# Altium footprint library X98_CARRIER_V1R2_12082022.PcbLib: 104 footprints (part 5 of 7)
Each footprint in its own frame and in the unit in brackets; x right, y up, seen from the top. Pads: shape width x height; smd on the part's side, far side on the other; paste and mask are expansions set on the pad; w line width, h text height; cw(c..) or ccw(c..) is an arc to the next point about the centre after c.
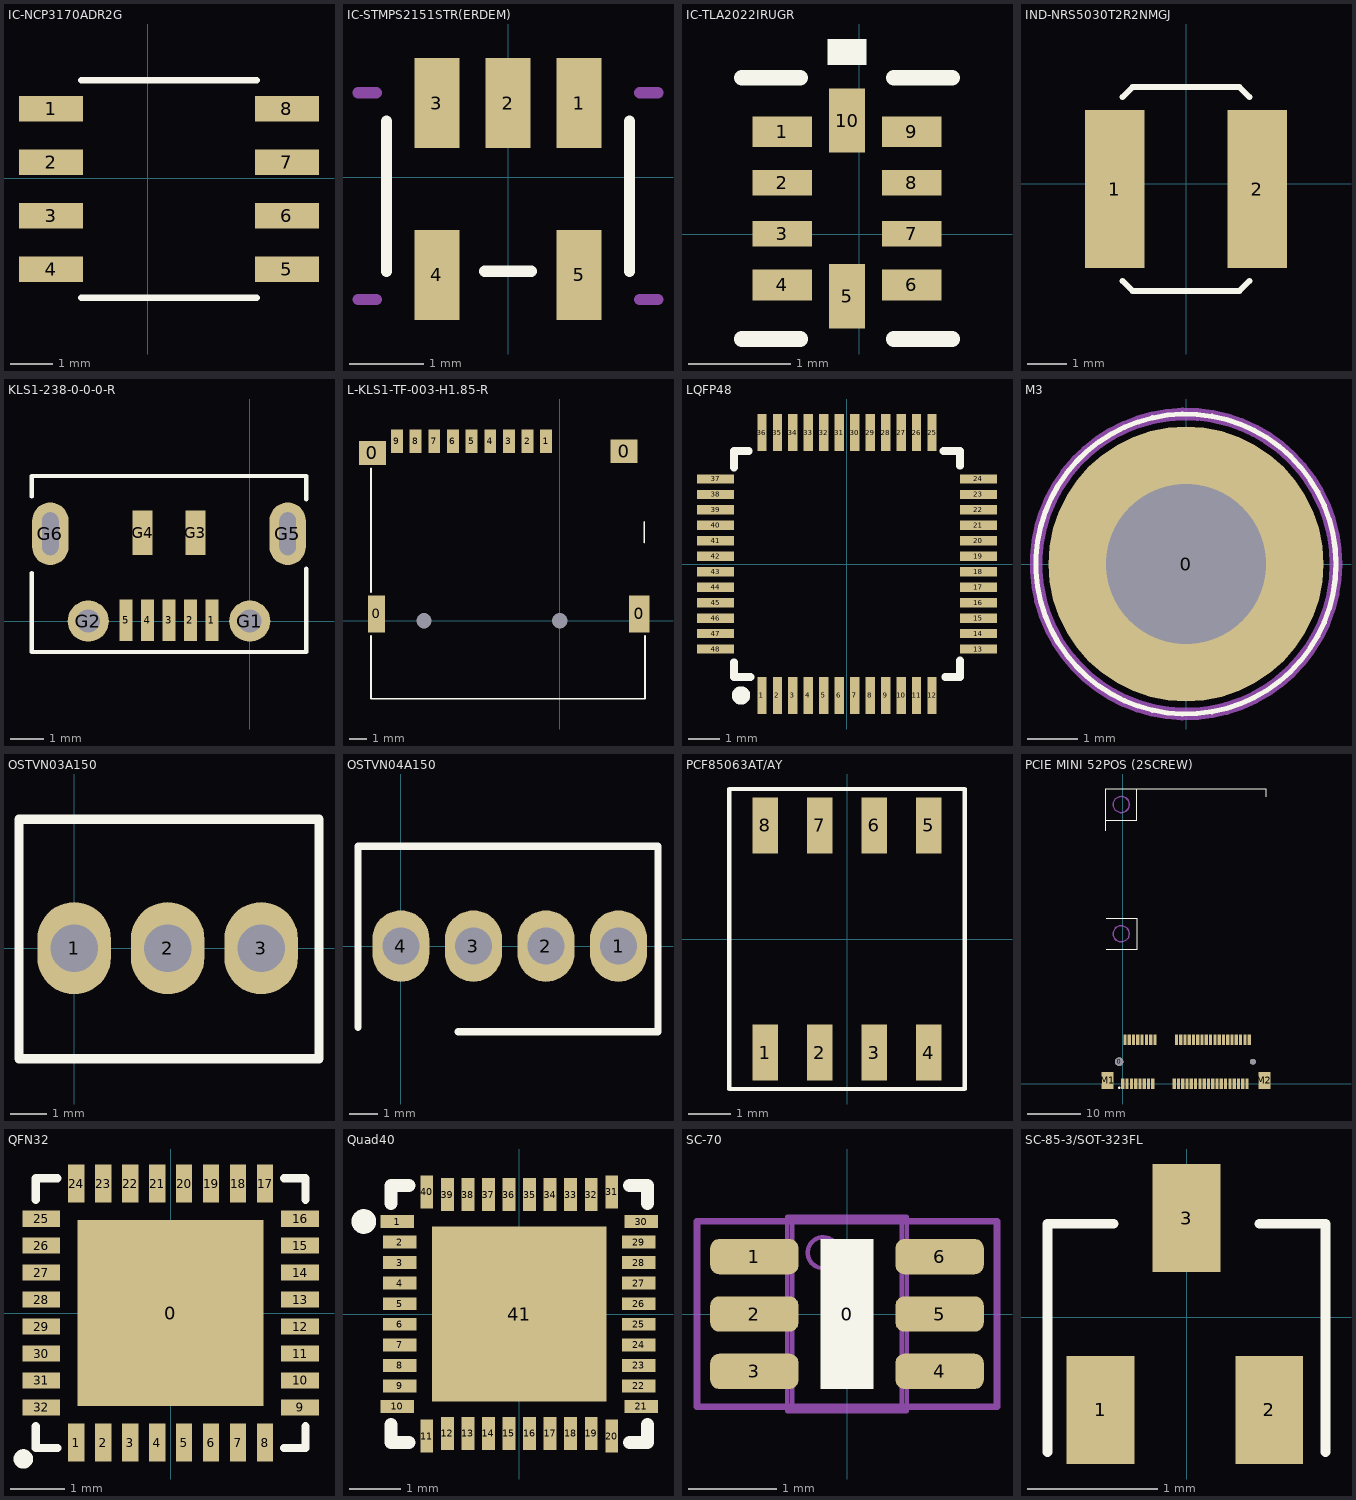
[diagram p4: the footprints below, top view; thin cyan lines are the x and y axes]

## IC-NCP3170ADR2G [mm]
pads (8):
  rect 1.52x0.6 smd paste+0 mask+0.05: 1(-2.294,1.651) 2(-2.294,0.381) 3(-2.294,-0.889) 4(-2.294,-2.159) 5(3.31,-2.159) 6(3.31,-0.889) 7(3.31,0.381) 8(3.31,1.651)
Top Overlay:
  lines w0.152: -1.575,-2.832 2.591,-2.832 ; -1.575,2.324 2.591,2.324
  text "." at -2.531,2.196 h0.76
3D body: height 0.25, standoff 0, extent 0.508,-0.254 0.762,0
3D body "SOIC8_ONS.step": height 1.76, standoff 0, extent -2.464,-2.705 3.734,2.197

## IC-STMPS2151STR(ERDEM) [mm]
pads (5):
  rect 0.6x1.2 smd paste+0 mask+0.05: 1(0.95,0.991) 2(0,0.991) 3(-0.95,0.991) 4(-0.95,-1.309) 5(0.95,-1.309)
Top Overlay:
  lines w0.152: -1.626,-1.257 -1.626,0.749 ; -0.312,-1.257 0.312,-1.257 ; 1.626,-1.257 1.626,0.749
  text "." at 0.816,2.058 h0.76
Mechanical 15:
  lines w0.152: -2.007,-1.638 -1.763,-1.638 ; -2.007,1.13 -1.763,1.13 ; 1.763,-1.638 2.007,-1.638 ; 1.763,1.13 2.007,1.13
3D body "SOT23-5L_STM-M.step": height 1.45, standoff 0, extent -1.499,-1.753 1.499,1.245

## IC-TLA2022IRUGR [mm]
pads (10):
  rect 0.58x0.3 smd paste-0.15 mask+0: 1(-0.754,1.004) 4(-0.754,-0.496) 6(0.516,-0.496) 9(0.516,1.004)
  rect 0.58x0.25 smd mask+0: 2(-0.754,0.504) 3(-0.754,0.004) 7(0.516,0.004) 8(0.516,0.504)
  rect 0.35x0.63 smd mask+0: 5(-0.119,-0.606) 10(-0.119,1.114)
Top Overlay:
  region: 0.072,1.658 -0.309,1.658 -0.309,1.912 0.072,1.912
  lines w0.152: -1.148,-1.025 -0.578,-1.025 ; -1.148,1.533 -0.578,1.533 ; 0.34,-1.025 0.91,-1.025 ; 0.34,1.533 0.91,1.533
  text "." at -1.276,0.917 h0.76
Top Paste:
  region: 0.006,1.379 -0.244,1.379 -0.244,0.849 0.006,0.849
  region: 0.781,1.129 0.251,1.129 0.251,0.879 0.781,0.879
  region: 0.781,0.629 0.251,0.629 0.251,0.379 0.781,0.379
  region: 0.781,0.129 0.251,0.129 0.251,-0.121 0.781,-0.121
  region: 0.781,-0.371 0.251,-0.371 0.251,-0.621 0.781,-0.621
  region: 0.006,-0.341 -0.244,-0.341 -0.244,-0.871 0.006,-0.871
  region: -0.489,-0.371 -1.019,-0.371 -1.019,-0.621 -0.489,-0.621
  region: -0.489,0.129 -1.019,0.129 -1.019,-0.121 -0.489,-0.121
  region: -0.489,0.629 -1.019,0.629 -1.019,0.379 -0.489,0.379
  region: -0.489,1.129 -1.019,1.129 -1.019,0.879 -0.489,0.879
Top Solder:
  region: 0.081,1.454 -0.319,1.454 -0.319,0.774 0.081,0.774
  region: 0.856,1.204 0.176,1.204 0.176,0.804 0.856,0.804
  region: 0.856,0.704 0.176,0.704 0.176,0.304 0.856,0.304
  region: 0.856,0.204 0.176,0.204 0.176,-0.196 0.856,-0.196
  region: 0.856,-0.296 0.176,-0.296 0.176,-0.696 0.856,-0.696
  region: 0.081,-0.266 -0.319,-0.266 -0.319,-0.946 0.081,-0.946
  region: -0.414,-0.296 -1.094,-0.296 -1.094,-0.696 -0.414,-0.696
  region: -0.414,0.204 -1.094,0.204 -1.094,-0.196 -0.414,-0.196
  region: -0.414,0.704 -1.094,0.704 -1.094,0.304 -0.414,0.304
  region: -0.414,1.204 -1.094,1.204 -1.094,0.804 -0.414,0.804
3D body: height 0.25, standoff 0, extent -0.119,0.254 0.135,0.508
3D body "RUG0010A.stp": height 0.4, standoff 0, extent -0.869,-0.746 0.631,1.254

## IND-NRS5030T2R2NMGJ [mil]
pads (2):
  rect 59x157 smd paste+0 mask+1.97: 1(-70.87,-5) 2(70.87,-5)
Top Overlay:
  lines w6: -63.15,-96.6 -53.25,-106.5 53.25,-106.5 63.15,-96.6 ; -63.15,86.6 -53.25,96.5 53.25,96.5 63.15,86.6
3D body "LQH5BPN3R3N38L.STEP": height 157.48, standoff 0, extent -96.46,-101.46 96.46,91.46

## KLS1-238-0-0-0-R [mm] "MICRO USB TYPE B"
height 3
pads (11):
  rect 0.4x1.25 smd: 1(-1.15,0.025) 2(-1.8,0.025) 3(-2.45,0.025) 4(-3.1,0.025) 5(-3.75,0.025)
  round 1.25 hole 0.7: G1(0,0) G2(-4.9,0)
  rect 0.6x1.35 smd: G3(-1.65,2.675) G4(-3.25,2.675)
  oval 1.1x1.9 hole 0.5 slot 1.3 at 90 deg: G5(1.15,2.65) G6(-6.05,2.65)
Top Overlay:
  lines w0.127: -6.616,1.464 -6.616,-0.782 -6.616,-0.934 1.716,-0.934 1.716,1.591 ; -6.616,3.776 -6.616,4.4 1.716,4.4 1.716,3.7
Top Paste:
  circle w0.94: c-4.9,0 r0.127
  circle w0.94: c0,0 r0.127
  region: -6.583,2.244 -6.583,2.137 -6.502,1.941 -6.352,1.791 -6.156,1.71 -6.05,1.71 -5.944,1.71 -5.748,1.791 -5.598,1.941 -5.517,2.137 -5.517,2.244 -5.517,3.031 -5.517,3.137 -5.598,3.333 -5.748,3.483 -5.944,3.564 -6.05,3.564 -6.156,3.564 -6.352,3.483 -6.502,3.333 -6.583,3.137 -6.583,3.031
  region: 0.617,2.244 0.617,2.137 0.698,1.941 0.848,1.791 1.044,1.71 1.15,1.71 1.256,1.71 1.452,1.791 1.602,1.941 1.683,2.137 1.683,2.244 1.683,3.031 1.683,3.137 1.602,3.333 1.452,3.483 1.256,3.564 1.15,3.564 1.044,3.564 0.848,3.483 0.698,3.333 0.617,3.137 0.617,3.031
Bottom Paste:
  circle w0.94: c-4.9,0 r0.127
  circle w0.94: c0,0 r0.127
  region: 1.683,2.244 1.683,2.137 1.602,1.941 1.452,1.791 1.256,1.71 1.15,1.71 1.044,1.71 0.848,1.791 0.698,1.941 0.617,2.137 0.617,2.244 0.617,3.031 0.617,3.137 0.698,3.333 0.848,3.483 1.044,3.564 1.15,3.564 1.256,3.564 1.452,3.483 1.602,3.333 1.683,3.137 1.683,3.031
  region: -5.517,2.244 -5.517,2.137 -5.598,1.941 -5.748,1.791 -5.944,1.71 -6.05,1.71 -6.156,1.71 -6.352,1.791 -6.502,1.941 -6.583,2.137 -6.583,2.244 -6.583,3.031 -6.583,3.137 -6.502,3.333 -6.352,3.483 -6.156,3.564 -6.05,3.564 -5.944,3.564 -5.748,3.483 -5.598,3.333 -5.517,3.137 -5.517,3.031
3D body "micro usb.stp": height 2.84, standoff -0.54, extent -6.8,-0.294 1.85,5.605

## L-KLS1-TF-003-H1.85-R [mm]
pads (15):
  rect 1.6x1.4 smd mask+0.051: 0(-11.05,9.9) 0(3.8,10)
  rect 1x2.2 smd mask+0.051: 0(-10.8,0.4)
  round 0 hole 0.9: 0(-8,0) 0(0,0)
  rect 1.2x2.2 smd mask+0.051: 0(4.7,0.4)
  rect 0.7x1.4 smd mask+0.051: 1(-0.799,10.6) 2(-1.899,10.6) 3(-2.999,10.6) 4(-4.099,10.6) 5(-5.199,10.6) 6(-6.299,10.6) 7(-7.399,10.6) 8(-8.499,10.6) 9(-9.599,10.6)
Top Overlay:
  lines w0.102: -11.127,-0.881 -11.127,-4.6 5.027,-4.6 5.027,-0.881 ; -11.127,1.681 -11.127,9 ; 4.989,5.834 4.992,4.62
3D body "micro sd.STEP": height 1.95, standoff -0.5, extent -11.05,-4.015 4.95,11.235

## LQFP48 [mm]
pads (48):
  rect 0.3x1.2 smd mask+0.051: 1(-2.75,-4.25) 2(-2.25,-4.25) 3(-1.75,-4.25) 4(-1.25,-4.25) 5(-0.75,-4.25) 6(-0.25,-4.25) 7(0.25,-4.25) 8(0.75,-4.25) 9(1.25,-4.25) 10(1.75,-4.25) 11(2.25,-4.25) 12(2.75,-4.25) 25(2.75,4.25) 26(2.25,4.25) 27(1.75,4.25) 28(1.25,4.25) 29(0.75,4.25) 30(0.25,4.25) 31(-0.25,4.25) 32(-0.75,4.25) 33(-1.25,4.25) 34(-1.75,4.25) 35(-2.25,4.25) 36(-2.75,4.25)
  rect 1.2x0.3 smd mask+0.051: 13(4.25,-2.75) 14(4.25,-2.25) 15(4.25,-1.75) 16(4.25,-1.25) 17(4.25,-0.75) 18(4.25,-0.25) 19(4.25,0.25) 20(4.25,0.75) 21(4.25,1.25) 22(4.25,1.75) 23(4.25,2.25) 24(4.25,2.75) 37(-4.25,2.75) 38(-4.25,2.25) 39(-4.25,1.75) 40(-4.25,1.25) 41(-4.25,0.75) 42(-4.25,0.25) 43(-4.25,-0.25) 44(-4.25,-0.75) 45(-4.25,-1.25) 46(-4.25,-1.75) 47(-4.25,-2.25) 48(-4.25,-2.75)
Top Overlay:
  circle w0.381: c-3.425,-4.25 r0.106
  lines w0.254: -3.65,-3.175 -3.65,-3.65 -3.125,-3.65 ; -3.65,3.125 -3.65,3.65 -3.175,3.65 ; 3.125,3.65 3.65,3.65 3.65,3.175 ; 3.175,-3.65 3.65,-3.65 3.65,-3.125
3D body "User Library-LQFP50P900X900X160.STEP": height -0.4, standoff -2, extent -4.5,-4.496 4.5,4.504

## M3 [mm]
pads (1):
  round 5.5 hole 3.2 mask+0.051: 0(0,0)
Top Overlay:
  circle w0.102: c0,0 r3
Bottom Overlay:
  circle w0.152: c0,0 r3
Mechanical 1:
  lines w0.254: 2.986,0.292 cw(c0,0) 2.985,0.296

## OSTVN03A150 [mm] "OSTVN04A150"
pads (3):
  oval 2x2.5 hole 1.3: 1(0,0) 2(2.54,0) 3(5.08,0)
Top Overlay:
  lines w0.254: -1.5,-3 -1.5,0 -1.5,3.5 6.65,3.5 6.65,-3 -1.5,-3
3D body "OSTVN03A150.stp": height 8.5, standoff -3.5, extent -1.47,-3.071 6.55,3.429

## OSTVN04A150 [mm] "OSTVN04A150"
pads (4):
  oval 2x2.5 hole 1.3: 1(7.62,0) 2(5.08,0) 3(2.54,0) 4(0,0)
Top Overlay:
  lines w0.254: -1.5,-2.848 -1.5,0 -1.5,3.5 9,3.5 9,-3 2.001,-3
3D body "OSTVN04A150--3DModel-STEP-56544.STEP": height 8.75, standoff -3.25, extent -1.58,-3.1 8.98,3.4

## PCF85063AT/AY [mm] "SO8"
pads (8):
  rect 0.6x1.3 smd mask+0.06: 1(-1.905,-2.65) 2(-0.635,-2.65) 3(0.635,-2.65) 4(1.905,-2.65) 5(1.905,2.65) 6(0.635,2.65) 7(-0.635,2.65) 8(-1.905,2.65)
Top Overlay:
  lines w0.102: -2.75,-3.5 2.75,-3.5 2.75,3.5 -2.75,3.5 -2.75,-3.5
  text "." at -3.3,-1.874 h0.76
3D body "8SIOC.stp": height 1.95, standoff 0, extent -2.502,-3.099 2.502,3.099

## PCIE MINI 52POS (2SCREW) [mm]
height 5.75
pads (56):
  round 1.6 hole 1.6 mask+0: 0(-0.7,4.1)
  round 1.1 hole 1.1 mask+0: 0(24.3,4.1)
  rect 0.6x2 smd mask+0.051: 1(0,0) 2(0.4,8.2) 3(0.8,0) 4(1.2,8.2) 5(1.6,0) 6(2,8.2) 7(2.4,0) 8(2.8,8.2) 9(3.2,0) 10(3.6,8.2) 11(4,0) 12(4.4,8.2) 13(4.8,0) 14(5.2,8.2) 15(5.6,0) 16(6,8.2) 17(9.6,0) 18(10,8.2) 19(10.4,0) 20(10.8,8.2) 21(11.2,0) 22(11.6,8.2) 23(12,0) 24(12.4,8.2) 25(12.8,0) 26(13.2,8.2) 27(13.6,0) 28(14,8.2) 29(14.4,0) 30(14.8,8.2) 31(15.2,0) 32(15.6,8.2) 33(16,0) 34(16.4,8.2) 35(16.8,0) 36(17.2,8.2) 37(17.6,0) 38(18,8.2) 39(18.4,0) 40(18.8,8.2) 41(19.2,0) 42(19.6,8.2) 43(20,0) 44(20.4,8.2) 45(20.8,0) 46(21.2,8.2) 47(21.6,0) 48(22,8.2) 49(22.4,0) 50(22.8,8.2) 51(23.2,0) 52(23.6,8.2)
  rect 2.3x3.2 smd mask+0.051: M1(-2.85,0.6) M2(26.45,0.6)
Top Overlay:
  circle w0.254: c-0.681,-0.758 r0.127
  lines w0.102: -3.2,47.291 -3.2,55.05 26.8,55.05 26.8,53.642 ; -3.2,49.25 2.6,49.25 2.6,55.05 ; -3.135,25.077 2.665,25.077 2.665,30.877 -3.135,30.877
Mechanical 1:
  circle w0.254: c-0.3,28 r1.5
  circle w0.254: c-0.3,52.15 r1.5
3D body "c-2041262-1-c-3d.stp": height 6.85, standoff -0.6, extent -3.198,-0.641 26.702,8.609

## QFN32 [mm]
height 1
pads (33):
  rect 3.45x3.45 smd paste-3.45 mask+0.051: 0(0,0)
  rect 0.3x0.7 smd mask+0.025: 1(-1.75,-2.4) 8(1.75,-2.4) 17(1.75,2.4) 24(-1.75,2.4)
  rect 0.3x0.7 smd mask+0.051: 2(-1.25,-2.4) 3(-0.75,-2.4) 4(-0.25,-2.4) 5(0.25,-2.4) 6(0.75,-2.4) 7(1.25,-2.4) 18(1.25,2.4) 19(0.75,2.4) 20(0.25,2.4) 21(-0.25,2.4) 22(-0.75,2.4) 23(-1.25,2.4)
  rect 0.7x0.3 smd mask+0.025: 9(2.4,-1.75) 16(2.4,1.75) 25(-2.4,1.75) 32(-2.4,-1.75)
  rect 0.7x0.3 smd mask+0.051: 10(2.4,-1.25) 11(2.4,-0.75) 12(2.4,-0.25) 13(2.4,0.25) 14(2.4,0.75) 15(2.4,1.25) 26(-2.4,1.25) 27(-2.4,0.75) 28(-2.4,0.25) 29(-2.4,-0.25) 30(-2.4,-0.75) 31(-2.4,-1.25)
Top Overlay:
  circle w0.2: c-2.732,-2.704 r0.08
  lines w0.152: -2.5,-2.1 -2.5,-2.5 -2.1,-2.5 ; -2.5,2.1 -2.5,2.5 -2.1,2.5 ; 2.1,-2.5 2.5,-2.5 2.5,-2.1 ; 2.1,2.5 2.5,2.5 2.5,2.1
Top Paste:
  rectangle: 0.25,-1.1 1.25,-0.1
  rectangle: -1.25,-1.1 -0.25,-0.1
  rectangle: 0.25,0.1 1.25,1.1
  rectangle: -1.25,0.1 -0.25,1.1
3D body "User Library-QFN32-1.STEP": height 0.9, standoff -0.03, extent -2.489,-2.515 2.512,2.486

## Quad40 [mm]
pads (41):
  rect 0.65x0.25 smd mask+0.025: 1(-2.375,1.8) 2(-2.325,1.4) 3(-2.325,1) 4(-2.325,0.6) 5(-2.325,0.2) 6(-2.325,-0.2) 7(-2.325,-0.6) 8(-2.325,-1) 9(-2.325,-1.4) 10(-2.375,-1.8) 21(2.375,-1.8) 22(2.325,-1.4) 23(2.325,-1) 24(2.325,-0.6) 25(2.325,-0.2) 26(2.325,0.2) 27(2.325,0.6) 28(2.325,1) 29(2.325,1.4) 30(2.375,1.8)
  rect 0.25x0.65 smd mask+0.025: 11(-1.8,-2.375) 12(-1.4,-2.325) 13(-1,-2.325) 14(-0.6,-2.325) 15(-0.2,-2.325) 16(0.2,-2.325) 17(0.6,-2.325) 18(1,-2.325) 19(1.4,-2.325) 20(1.8,-2.375) 31(1.8,2.375) 32(1.4,2.325) 33(1,2.325) 34(0.6,2.325) 35(0.2,2.325) 36(-0.2,2.325) 37(-0.6,2.325) 38(-1,2.325) 39(-1.4,2.325) 40(-1.8,2.375)
  rect 3.4x3.4 smd mask+0.051: 41(0,0)
Top Overlay:
  circle w0.254: c-3.025,1.8 r0.114
  lines w0.254: -2.5,-2.15 -2.5,-2.5 -2.15,-2.5 ; -2.5,2.15 -2.5,2.5 -2.15,2.5 ; 2.15,-2.5 2.5,-2.5 2.5,-2.15 ; 2.15,2.5 2.5,2.5 2.5,2.15
3D body "User Library-QFN 40 5x5.step": height 0.73, standoff -0.02, extent -2.501,-2.501 2.501,2.501

## SC-70 [mm] "Small outline 2.1mm L x 1.25mm W x 1mm H"
height 1
pads (7):
  round 0.5 on Mech15: 0(0,0)
  rrect50% 1x0.4 smd mask+0.051: 1(-1.05,0.65) 2(-1.05,0) 3(-1.05,-0.65) 4(1.05,-0.65) 5(1.05,0) 6(1.05,0.65)
Top Overlay:
  rectangle: -0.3,-0.851 0.3,0.849
  text "." at -0.983,1.075 h0.76
Mechanical 13:
  circle w0.05: c-0.27,0.695 r0.175
  lines w0.05: -1.028,-0.8 -1.028,-0.5 ; -1.028,-0.15 -1.028,0.15 ; -1.028,0.5 -1.028,0.8 ; -0.937,-0.8 -0.937,-0.5 ; -0.937,-0.15 -0.937,0.15 ; -0.937,0.5 -0.937,0.8 ; -0.925,-0.8 -0.925,-0.5 ; -0.925,-0.15 -0.925,0.15 ; -0.925,0.5 -0.925,0.8 ; 0.925,-0.8 0.925,-0.5 ; 0.925,-0.15 0.925,0.15 ; 0.925,0.5 0.925,0.8 ; 0.937,-0.8 0.937,-0.5 ; 0.937,-0.15 0.937,0.15 ; 0.937,0.5 0.937,0.8 ; 1.028,-0.8 1.028,-0.5 ; 1.028,-0.15 1.028,0.15 ; 1.028,0.5 1.028,0.8 ; -0.675,-1.1 0.675,-1.1 ; -0.675,-1.1 -0.675,1.1 ; -0.675,-1.1 -0.619,-1.044 ; -0.675,1.1 0.675,1.1 ; -0.675,1.1 -0.619,1.044 ; -0.619,-1.044 0.619,-1.044 ; -0.619,-1.044 -0.619,1.044 ; -0.619,1.044 0.619,1.044 ; 0.619,-1.044 0.675,-1.1 ; 0.619,-1.044 0.619,1.044 ; 0.619,1.044 0.675,1.1 ; 0.675,-1.1 0.675,1.1 ; -1.2,-0.8 -1.2,-0.5 -0.654,-0.5 -0.654,-0.8 -1.2,-0.8 ; -1.2,-0.15 -1.2,0.15 -0.654,0.15 -0.654,-0.15 -1.2,-0.15 ; -1.2,0.5 -1.2,0.8 -0.654,0.8 -0.654,0.5 -1.2,0.5 ; 0.654,-0.8 1.2,-0.8 1.2,-0.5 0.654,-0.5 0.654,-0.8 ; 0.654,-0.15 1.2,-0.15 1.2,0.15 0.654,0.15 0.654,-0.15 ; 0.654,0.5 1.2,0.5 1.2,0.8 0.654,0.8 0.654,0.5
Mechanical 15:
  lines w0.076: -1.7,-1.05 -1.7,1.05 1.7,1.05 1.7,-1.05 -1.7,-1.05
3D body "User Library-SC70-6.STEP": height 0.92, standoff -0.03, extent -1.05,-0.991 1.05,1.009

## SC-85-3/SOT-323FL [mm]
height 1
pads (3):
  rect 0.52x0.83 smd mask+0.051: 1(-0.66,-0.711) 2(0.635,-0.711) 3(0,0.762)
Top Overlay:
  lines w0.076: -1.067,-1.035 -1.067,0.718 -0.559,0.718 ; 0.559,0.718 1.067,0.718 1.067,-1.035
3D body "User Library-SOT323 (SC70-3)-1.STEP": height 1.1, standoff 0, extent -1.108,-1.097 1.092,1.148